# Altium footprint library CPU_STM.PcbLib: 216 footprints (part 1 of 15)
Each footprint in its own frame and in the unit in brackets; x right, y up, seen from the top. Pads: shape width x height; smd on the part's side, far side on the other; paste and mask are expansions set on the pad; w line width, h text height; cw(c..) or ccw(c..) is an arc to the next point about the centre after c.
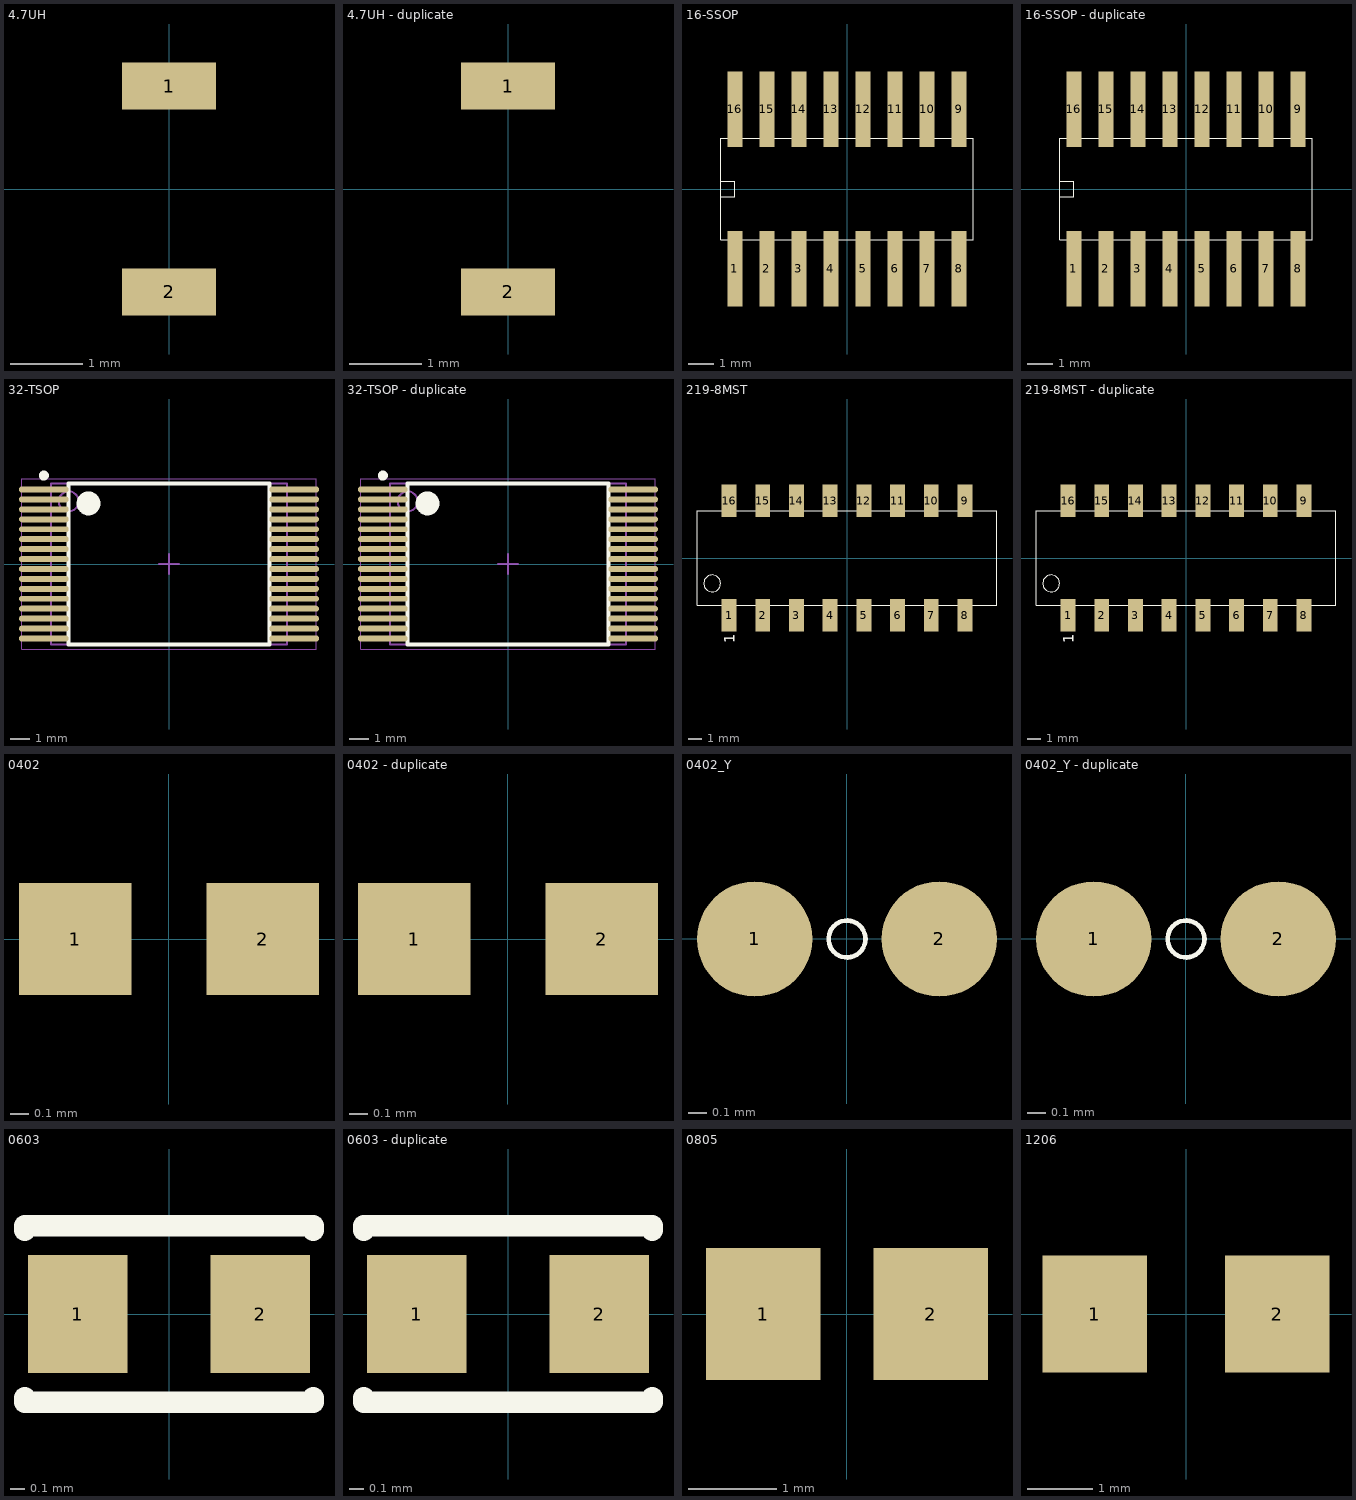
[diagram p0: the footprints below, top view; thin cyan lines are the x and y axes]

## 4.7UH [mm]
pads (2):
  rect 1.3x0.65 smd: 1(0,1.422) 2(0,-1.422)

## 4.7UH - duplicate [mm]
pads (2):
  rect 1.3x0.65 smd: 1(0,1.422) 2(0,-1.422)

## 16-SSOP [mm]
pads (16):
  rect 0.6x3 smd: 1(-4.445,-3.162) 2(-3.175,-3.162) 3(-1.905,-3.162) 4(-0.635,-3.162) 5(0.635,-3.162) 6(1.905,-3.162) 7(3.175,-3.162) 8(4.445,-3.162) 9(4.445,3.162) 10(3.175,3.162) 11(1.905,3.162) 12(0.635,3.162) 13(-0.635,3.162) 14(-1.905,3.162) 15(-3.175,3.162) 16(-4.445,3.162)
Top Overlay:
  lines w0.025: -5.004,-2.007 5.004,-2.007 5.004,2.007 -5.004,2.007 -5.004,-2.007 ; -5.004,-0.305 -4.445,-0.305 -4.445,0.305 -5.004,0.305 -5.004,-0.305

## 16-SSOP - duplicate [mm]
pads (16):
  rect 0.6x3 smd: 1(-4.445,-3.162) 2(-3.175,-3.162) 3(-1.905,-3.162) 4(-0.635,-3.162) 5(0.635,-3.162) 6(1.905,-3.162) 7(3.175,-3.162) 8(4.445,-3.162) 9(4.445,3.162) 10(3.175,3.162) 11(1.905,3.162) 12(0.635,3.162) 13(-0.635,3.162) 14(-1.905,3.162) 15(-3.175,3.162) 16(-4.445,3.162)
Top Overlay:
  lines w0.025: -5.004,-2.007 -5.004,2.007 5.004,2.007 5.004,-2.007 -5.004,-2.007 ; -5.004,-0.305 -5.004,0.305 -4.445,0.305 -4.445,-0.305 -5.004,-0.305

## 32-TSOP [mm] "SOP, 32-Leads, Body 11.9x8.1mm, Pitch 0.5mm, IPC Medium Density"
height 1.25
pads (32):
  oval 2.5x0.3 smd mask+0.005: 1(-6.3,3.75) 2(-6.3,3.25) 3(-6.3,2.75) 4(-6.3,2.25) 5(-6.3,1.75) 6(-6.3,1.25) 7(-6.3,0.75) 8(-6.3,0.25) 9(-6.3,-0.25) 10(-6.3,-0.75) 11(-6.3,-1.25) 12(-6.3,-1.75) 13(-6.3,-2.25) 14(-6.3,-2.75) 15(-6.3,-3.25) 16(-6.3,-3.75) 17(6.3,-3.75) 18(6.3,-3.25) 19(6.3,-2.75) 20(6.3,-2.25) 21(6.3,-1.75) 22(6.3,-1.25) 23(6.3,-0.75) 24(6.3,-0.25) 25(6.3,0.25) 26(6.3,0.75) 27(6.3,1.25) 28(6.3,1.75) 29(6.3,2.25) 30(6.3,2.75) 31(6.3,3.25) 32(6.3,3.75)
Top Overlay:
  circle w0.6: c-4.05,3.05 r0.3
  circle w0.25: c-6.3,4.45 r0.125
  lines w0.2: -5.05,-4.05 5.05,-4.05 5.05,4.05 -5.05,4.05 -5.05,-4.05
Mechanical 13:
  circle w0.1: c-5.05,3.15 r0.5
  lines w0.1: -5.95,-4.05 5.95,-4.05 5.95,4.05 -5.95,4.05 -5.95,-4.05
Mechanical 15:
  lines w0.05: -7.4,-4.3 7.4,-4.3 7.4,4.3 -7.4,4.3 -7.4,-4.3
  lines w0.1: -0.5,0 0.5,0 ; 0,-0.5 0,0.5
3D body: height 1.25, standoff 0.05, extent -5.95,-4.05 5.95,4.05

## 32-TSOP - duplicate [mm] "SOP, 32-Leads, Body 11.9x8.1mm, Pitch 0.5mm, IPC Medium Density"
height 1.25
pads (32):
  oval 2.5x0.3 smd mask+0.005: 1(-6.3,3.75) 2(-6.3,3.25) 3(-6.3,2.75) 4(-6.3,2.25) 5(-6.3,1.75) 6(-6.3,1.25) 7(-6.3,0.75) 8(-6.3,0.25) 9(-6.3,-0.25) 10(-6.3,-0.75) 11(-6.3,-1.25) 12(-6.3,-1.75) 13(-6.3,-2.25) 14(-6.3,-2.75) 15(-6.3,-3.25) 16(-6.3,-3.75) 17(6.3,-3.75) 18(6.3,-3.25) 19(6.3,-2.75) 20(6.3,-2.25) 21(6.3,-1.75) 22(6.3,-1.25) 23(6.3,-0.75) 24(6.3,-0.25) 25(6.3,0.25) 26(6.3,0.75) 27(6.3,1.25) 28(6.3,1.75) 29(6.3,2.25) 30(6.3,2.75) 31(6.3,3.25) 32(6.3,3.75)
Top Overlay:
  circle w0.25: c-6.3,4.45 r0.125
  circle w0.6: c-4.05,3.05 r0.3
  lines w0.2: -5.05,-4.05 -5.05,4.05 5.05,4.05 5.05,-4.05 -5.05,-4.05
Mechanical 13:
  circle w0.1: c-5.05,3.15 r0.5
  lines w0.1: -5.95,-4.05 -5.95,4.05 5.95,4.05 5.95,-4.05 -5.95,-4.05
Mechanical 15:
  lines w0.05: -7.4,-4.3 -7.4,4.3 7.4,4.3 7.4,-4.3 -7.4,-4.3
  lines w0.1: -0.5,0 0.5,0 ; 0,-0.5 0,0.5
3D body: height 1.25, standoff 0.05, extent -5.95,-4.05 5.95,4.05

## 219-8MST [mil] "219-8MST"
pads (16):
  rect 44x96 smd: 1(-350,-170) 2(-250,-170) 3(-150,-170) 4(-50,-170) 5(50,-170) 6(150,-170) 7(250,-170) 8(350,-170) 9(350,170) 10(250,170) 11(150,170) 12(50,170) 13(-50,170) 14(-150,170) 15(-250,170) 16(-350,170)
Top Overlay:
  circle w1: c-400,-75 r25
  lines w1: -445,-140 -445,140 445,140 445,-140 -445,-140
  text "1" at -333,-253 h31

## 219-8MST - duplicate [mil] "219-8MST"
pads (16):
  rect 44x96 smd: 1(-350,-170) 2(-250,-170) 3(-150,-170) 4(-50,-170) 5(50,-170) 6(150,-170) 7(250,-170) 8(350,-170) 9(350,170) 10(250,170) 11(150,170) 12(50,170) 13(-50,170) 14(-150,170) 15(-250,170) 16(-350,170)
Top Overlay:
  circle w1: c-400,-75 r25
  lines w1: -445,-140 -445,140 445,140 445,-140 -445,-140
  text "1" at -333,-253 h31

## 0402 [mm]
pads (2):
  rect 0.6x0.6 smd mask+0.06: 1(-0.5,0) 2(0.5,0)

## 0402 - duplicate [mm]
pads (2):
  rect 0.6x0.6 smd mask+0.06: 1(-0.5,0) 2(0.5,0)

## 0402_Y [mil] "SM-7351-RES-0402"
pads (2):
  round 25 smd: 1(-20,0) 2(20,0)
Top Overlay:
  circle w1: c0,0 r4

## 0402_Y - duplicate [mil] "SM-7351-RES-0402"
pads (2):
  round 25 smd: 1(-20,0) 2(20,0)
Top Overlay:
  circle w1: c0,0 r4

## 0603 [mil] "0603_CC"
pads (2):
  rect 28x33 smd: 1(-25.59,0) 2(25.59,0)
Top Overlay:
  lines w6: -40.47,-23.54 -40.47,-24.72 40.47,-24.72 40.47,-23.54 ; -40.47,23.54 -40.47,24.72 40.47,24.72 40.47,23.54

## 0603 - duplicate [mil] "0603_CC"
pads (2):
  rect 28x33 smd: 1(-25.59,0) 2(25.59,0)
Top Overlay:
  lines w6: -40.47,-23.54 -40.47,-24.72 40.47,-24.72 40.47,-23.54 ; -40.47,23.54 -40.47,24.72 40.47,24.72 40.47,23.54

## 0805 [mm]
pads (2):
  rect 1.3x1.5 smd: 1(-0.95,0) 2(0.95,0)
3D body "User Library-RES_2013-0805.step": height 0.76, standoff 0, extent -1.1,-0.675 1.2,0.675

## 1206 [mm]
pads (2):
  rect 1.6x1.8 smd: 1(-1.4,0) 2(1.4,0)